# Altium footprint library EwgConnectors.PcbLib: 125 footprints (part 3 of 8)
Each footprint in its own frame and in the unit in brackets; x right, y up, seen from the top. Pads: shape width x height; smd on the part's side, far side on the other; paste and mask are expansions set on the pad; w line width, h text height; cw(c..) or ccw(c..) is an arc to the next point about the centre after c.
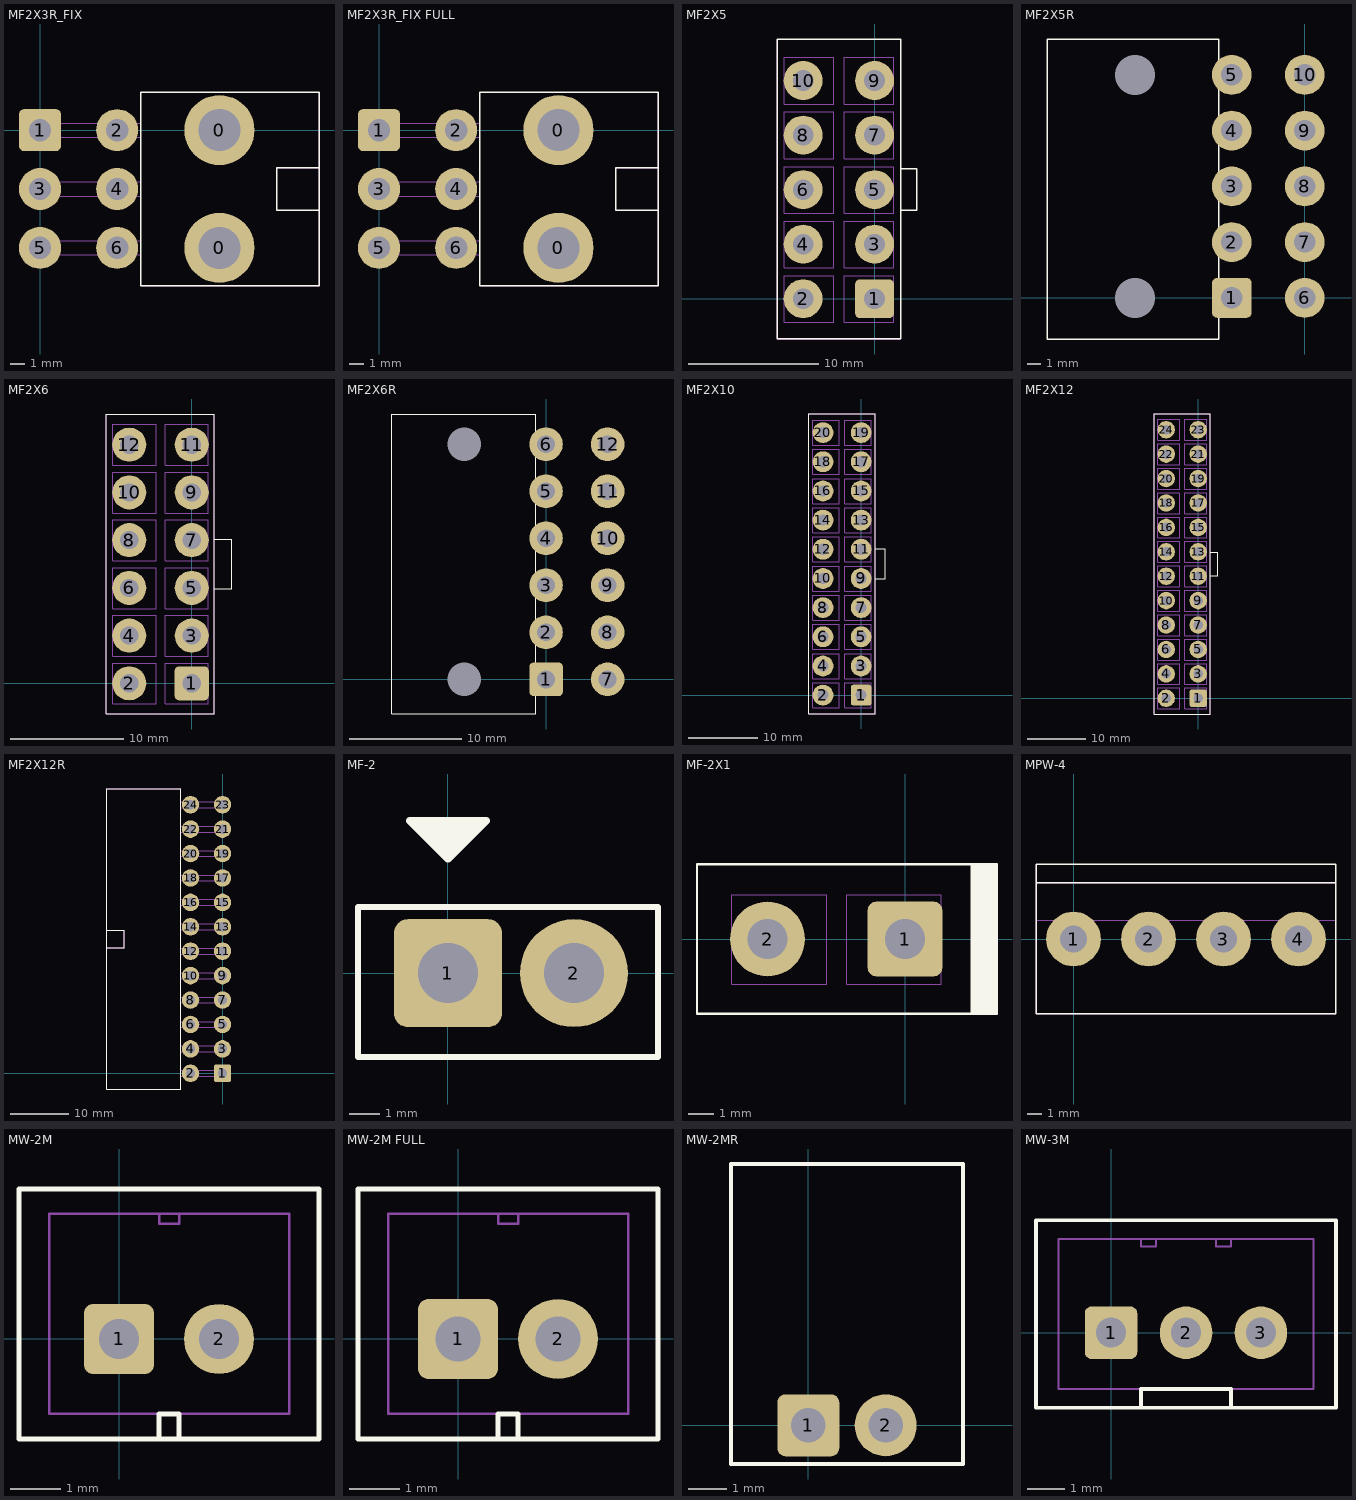
[diagram p2: the footprints below, top view; thin cyan lines are the x and y axes]

## MF2X3R_FIX [mm]
pads (8):
  round 5 hole 3: 0(12.8,-8.4) 0(12.8,0)
  rrect25% 3x3 hole 1.6: 1(0,0)
  round 3 hole 1.6: 2(5.5,0) 3(0,-4.2) 4(5.5,-4.2) 5(0,-8.4) 6(5.5,-8.4)
Top Overlay:
  lines w0.1: 19.9,-5.7 16.9,-5.7 16.9,-2.7 19.9,-2.7 ; 7.2,-11.1 7.2,2.7 19.9,2.7 19.9,-11.1 7.2,-11.1
Mechanical 1:
  lines w0.05: 7.2,-8.9 -0.6,-8.9 -0.6,-8.8 -0.6,-7.9 7.2,-7.9 ; 7.2,-4.7 -0.6,-4.7 -0.6,-4.6 -0.6,-3.7 7.2,-3.7 ; 7.2,-0.5 -0.6,-0.5 -0.6,-0.4 -0.6,0.5 7.2,0.5 ; 19.9,-5.7 16.9,-5.7 16.9,-4.2 16.9,-2.7 19.9,-2.7 ; 7.2,-11.1 7.2,2.7 19.9,2.7 19.9,-11.1 7.2,-11.1
3D body: height 11.4, standoff -3.6, extent -0.575,-11.1 19.36,3.1

## MF2X3R_FIX FULL [mm]
pads (8):
  round 5 hole 3: 0(12.8,-8.4) 0(12.8,0)
  rrect25% 3x3 hole 1.6: 1(0,0)
  round 3 hole 1.6: 2(5.5,0) 3(0,-4.2) 4(5.5,-4.2) 5(0,-8.4) 6(5.5,-8.4)
Top Overlay:
  lines w0.1: 19.9,-5.7 16.9,-5.7 16.9,-2.7 19.9,-2.7 ; 7.2,-11.1 7.2,2.7 19.9,2.7 19.9,-11.1 7.2,-11.1
Mechanical 1:
  lines w0.05: 7.2,-8.9 -0.6,-8.9 -0.6,-8.8 -0.6,-7.9 7.2,-7.9 ; 7.2,-4.7 -0.6,-4.7 -0.6,-4.6 -0.6,-3.7 7.2,-3.7 ; 7.2,-0.5 -0.6,-0.5 -0.6,-0.4 -0.6,0.5 7.2,0.5 ; 19.9,-5.7 16.9,-5.7 16.9,-4.2 16.9,-2.7 19.9,-2.7 ; 7.2,-11.1 7.2,2.7 19.9,2.7 19.9,-11.1 7.2,-11.1
3D body: height 11.4, standoff -3.6, extent -0.575,-11.1 19.36,3.1
3D body: height 14.1, standoff -0.3, extent 10.625,-11.075 30.225,2.725

## MF2X5 [mm]
pads (10):
  rrect25% 3x3 hole 1.6: 1(0,0)
  round 3 hole 1.6: 2(-5.5,0) 3(0,4.2) 4(-5.5,4.2) 5(0,8.4) 6(-5.5,8.4) 7(0,12.6) 8(-5.5,12.6) 9(0,16.8) 10(-5.5,16.8)
Top Overlay:
  lines w0.1: 2,6.8 3.25,6.8 3.25,10 2,10 ; -7.5,-3.1 -7.5,20 2,20 2,-3.1 -7.5,-3.1
Mechanical 1:
  lines w0.05: -7.5,-3.1 -7.5,20 2,20 2,-3.1 -7.5,-3.1 ; -6.94,-1.82 -6.94,1.78 -3.14,1.78 -3.14,-1.82 -6.94,-1.82 ; -6.94,2.38 -3.14,2.38 -3.14,5.98 -6.94,5.98 -6.94,2.38 ; -6.94,6.58 -3.14,6.58 -3.14,10.18 -6.94,10.18 -6.94,6.58 ; -6.94,10.78 -6.94,14.38 -3.14,14.38 -3.14,10.78 -6.94,10.78 ; -6.94,14.98 -3.14,14.98 -3.14,18.58 -6.94,18.58 -6.94,14.98 ; -2.34,-1.82 -2.34,1.78 1.46,1.78 1.46,-1.82 -2.34,-1.82 ; -2.34,2.38 1.46,2.38 1.46,5.98 -2.34,5.98 -2.34,2.38 ; -2.34,6.58 1.46,6.58 1.46,10.18 -2.34,10.18 -2.34,6.58 ; -2.34,10.78 1.46,10.78 1.46,14.38 -2.34,14.38 -2.34,10.78 ; -2.34,14.98 1.46,14.98 1.46,18.58 -2.34,18.58 -2.34,14.98
3D body: height 12.8, standoff -3.5, extent -7.8,-3.1 3.2,19.9

## MF2X5R [mm]
pads (12):
  round 0 hole 3 unplated: 0(-12.8,0) 0(-12.8,16.8)
  rrect25% 3x3 hole 1.6: 1(-5.5,0)
  round 3 hole 1.6: 2(-5.5,4.2) 3(-5.5,8.4) 4(-5.5,12.6) 5(-5.5,16.8) 6(0,0) 7(0,4.2) 8(0,8.4) 9(0,12.6) 10(0,16.8)
Top Overlay:
  lines w0.1: -19.4,-3.1 -6.5,-3.1 -6.5,19.5 -19.4,19.5 -19.4,-3.1
3D body: height 11.4, standoff -3.6, extent -19.4,-3.1 0.535,19.5

## MF2X6 [mm]
pads (12):
  rrect25% 3x3 hole 1.6: 1(0,0)
  round 3 hole 1.6: 2(-5.5,0) 3(0,4.2) 4(-5.5,4.2) 5(0,8.4) 6(-5.5,8.4) 7(0,12.6) 8(-5.5,12.6) 9(0,16.8) 10(-5.5,16.8) 11(0,21) 12(-5.5,21)
Top Overlay:
  lines w0.1: 2,8.3 3.5,8.3 3.5,12.7 2,12.7 ; -7.5,-2.7 2,-2.7 2,23.7 -7.5,23.7 -7.5,-2.7
Mechanical 1:
  lines w0.05: -7.5,-2.7 2,-2.7 2,23.7 -7.5,23.7 -7.5,-2.7 ; -6.94,-1.82 -3.14,-1.82 -3.14,1.78 -6.94,1.78 -6.94,-1.82 ; -6.94,2.38 -6.94,5.98 -3.14,5.98 -3.14,2.38 -6.94,2.38 ; -6.94,6.58 -6.94,10.18 -3.14,10.18 -3.14,6.58 -6.94,6.58 ; -6.94,10.78 -3.14,10.78 -3.14,14.38 -6.94,14.38 -6.94,10.78 ; -6.94,14.98 -6.94,18.58 -3.14,18.58 -3.14,14.98 -6.94,14.98 ; -6.94,19.18 -3.14,19.18 -3.14,22.78 -6.94,22.78 -6.94,19.18 ; -2.34,-1.82 1.46,-1.82 1.46,1.78 -2.34,1.78 -2.34,-1.82 ; -2.34,2.38 -2.34,5.98 1.46,5.98 1.46,2.38 -2.34,2.38 ; -2.34,6.58 -2.34,10.18 1.46,10.18 1.46,6.58 -2.34,6.58 ; -2.34,10.78 -2.34,14.38 1.46,14.38 1.46,10.78 -2.34,10.78 ; -2.34,14.98 -2.34,18.58 1.46,18.58 1.46,14.98 -2.34,14.98 ; -2.34,19.18 -2.34,22.78 1.46,22.78 1.46,19.18 -2.34,19.18

## MF2X6R [mm]
pads (14):
  round 0 hole 3 unplated: 0(-7.3,0) 0(-7.3,21)
  rrect25% 3x3 hole 1.6: 1(0,0)
  round 3 hole 1.6: 2(0,4.2) 3(0,8.4) 4(0,12.6) 5(0,16.8) 6(0,21) 7(5.5,0) 8(5.5,4.2) 9(5.5,8.4) 10(5.5,12.6) 11(5.5,16.8) 12(5.5,21)
Top Overlay:
  lines w0.1: -13.8,-3.1 -0.9,-3.1 -0.9,23.7 -13.8,23.7 -13.8,-3.1
3D body: height 11.4, standoff -3.6, extent -13.835,-3.1 6.1,23.7

## MF2X10 [mm]
pads (20):
  rrect25% 3x3 hole 1.6: 1(0,0)
  round 3 hole 1.6: 2(-5.5,0) 3(0,4.2) 4(-5.5,4.2) 5(0,8.4) 6(-5.5,8.4) 7(0,12.6) 8(-5.5,12.6) 9(0,16.8) 10(-5.5,16.8) 11(0,21) 12(-5.5,21) 13(0,25.2) 14(-5.5,25.2) 15(0,29.4) 16(-5.5,29.4) 17(0,33.6) 18(-5.5,33.6) 19(0,37.8) 20(-5.5,37.8)
Top Overlay:
  lines w0.1: 2.06,16.78 3.46,16.78 3.46,21.08 2.06,21.08 ; -7.54,-2.72 2.06,-2.72 2.06,40.48 -7.54,40.48 -7.54,-2.72
Mechanical 1:
  lines w0.05: -7.54,-2.72 2.06,-2.72 2.06,40.48 -7.54,40.48 -7.54,-2.72 ; -6.94,-1.82 -3.14,-1.82 -3.14,1.78 -6.94,1.78 -6.94,-1.82 ; -6.94,2.38 -6.94,5.98 -3.14,5.98 -3.14,2.38 -6.94,2.38 ; -6.94,6.58 -6.94,10.18 -3.14,10.18 -3.14,6.58 -6.94,6.58 ; -6.94,10.78 -3.14,10.78 -3.14,14.38 -6.94,14.38 -6.94,10.78 ; -6.94,14.98 -6.94,18.58 -3.14,18.58 -3.14,14.98 -6.94,14.98 ; -6.94,19.18 -3.14,19.18 -3.14,22.78 -6.94,22.78 -6.94,19.18 ; -6.94,23.38 -6.94,26.98 -3.14,26.98 -3.14,23.38 -6.94,23.38 ; -6.94,27.58 -3.14,27.58 -3.14,31.18 -6.94,31.18 -6.94,27.58 ; -6.94,31.78 -6.94,35.38 -3.14,35.38 -3.14,31.78 -6.94,31.78 ; -6.94,35.98 -3.14,35.98 -3.14,39.58 -6.94,39.58 -6.94,35.98 ; -2.34,-1.82 1.46,-1.82 1.46,1.78 -2.34,1.78 -2.34,-1.82 ; -2.34,2.38 -2.34,5.98 1.46,5.98 1.46,2.38 -2.34,2.38 ; -2.34,6.58 -2.34,10.18 1.46,10.18 1.46,6.58 -2.34,6.58 ; -2.34,10.78 1.46,10.78 1.46,14.38 -2.34,14.38 -2.34,10.78 ; -2.34,14.98 -2.34,18.58 1.46,18.58 1.46,14.98 -2.34,14.98 ; -2.34,19.18 1.46,19.18 1.46,22.78 -2.34,22.78 -2.34,19.18 ; -2.34,23.38 -2.34,26.98 1.46,26.98 1.46,23.38 -2.34,23.38 ; -2.34,27.58 1.46,27.58 1.46,31.18 -2.34,31.18 -2.34,27.58 ; -2.34,31.78 -2.34,35.38 1.46,35.38 1.46,31.78 -2.34,31.78 ; -2.34,35.98 1.46,35.98 1.46,39.58 -2.34,39.58 -2.34,35.98

## MF2X12 [mm]
pads (24):
  rrect25% 3x3 hole 1.6: 1(0,0)
  round 3 hole 1.6: 2(-5.5,0) 3(0,4.2) 4(-5.5,4.2) 5(0,8.4) 6(-5.5,8.4) 7(0,12.6) 8(-5.5,12.6) 9(0,16.8) 10(-5.5,16.8) 11(0,21) 12(-5.5,21) 13(0,25.2) 14(-5.5,25.2) 15(0,29.4) 16(-5.5,29.4) 17(0,33.6) 18(-5.5,33.6) 19(0,37.8) 20(-5.5,37.8) 21(0,42) 22(-5.5,42) 23(0,46.2) 24(-5.5,46.2)
Top Overlay:
  lines w0.1: 2.1,21.1 3.4,21.1 3.4,25.1 2.1,25.1 ; -7.6,-2.7 -7.6,48.9 2.1,48.9 2.1,-2.7 -7.6,-2.7
Mechanical 1:
  lines w0.05: -7.6,-2.7 -7.6,48.9 2.1,48.9 2.1,-2.7 -7.6,-2.7 ; -6.94,-1.82 -3.14,-1.82 -3.14,1.78 -6.94,1.78 -6.94,-1.82 ; -6.94,2.38 -3.14,2.38 -3.14,5.98 -6.94,5.98 -6.94,2.38 ; -6.94,6.58 -3.14,6.58 -3.14,10.18 -6.94,10.18 -6.94,6.58 ; -6.94,10.78 -6.94,14.38 -3.14,14.38 -3.14,10.78 -6.94,10.78 ; -6.94,14.98 -3.14,14.98 -3.14,18.58 -6.94,18.58 -6.94,14.98 ; -6.94,19.18 -6.94,22.78 -3.14,22.78 -3.14,19.18 -6.94,19.18 ; -6.94,23.38 -3.14,23.38 -3.14,26.98 -6.94,26.98 -6.94,23.38 ; -6.94,27.58 -3.14,27.58 -3.14,31.18 -6.94,31.18 -6.94,27.58 ; -6.94,31.78 -3.14,31.78 -3.14,35.38 -6.94,35.38 -6.94,31.78 ; -6.94,35.98 -3.14,35.98 -3.14,39.58 -6.94,39.58 -6.94,35.98 ; -6.94,40.18 -3.14,40.18 -3.14,43.78 -6.94,43.78 -6.94,40.18 ; -6.94,44.38 -3.14,44.38 -3.14,47.98 -6.94,47.98 -6.94,44.38 ; -2.34,-1.82 1.46,-1.82 1.46,1.78 -2.34,1.78 -2.34,-1.82 ; -2.34,2.38 1.46,2.38 1.46,5.98 -2.34,5.98 -2.34,2.38 ; -2.34,6.58 1.46,6.58 1.46,10.18 -2.34,10.18 -2.34,6.58 ; -2.34,10.78 -2.34,14.38 1.46,14.38 1.46,10.78 -2.34,10.78 ; -2.34,14.98 1.46,14.98 1.46,18.58 -2.34,18.58 -2.34,14.98 ; -2.34,19.18 -2.34,22.78 1.46,22.78 1.46,19.18 -2.34,19.18 ; -2.34,23.38 1.46,23.38 1.46,26.98 -2.34,26.98 -2.34,23.38 ; -2.34,27.58 1.46,27.58 1.46,31.18 -2.34,31.18 -2.34,27.58 ; -2.34,31.78 1.46,31.78 1.46,35.38 -2.34,35.38 -2.34,31.78 ; -2.34,35.98 1.46,35.98 1.46,39.58 -2.34,39.58 -2.34,35.98 ; -2.34,40.18 1.46,40.18 1.46,43.78 -2.34,43.78 -2.34,40.18 ; -2.34,44.38 1.46,44.38 1.46,47.98 -2.34,47.98 -2.34,44.38

## MF2X12R [mm]
pads (24):
  rrect25% 3x3 hole 1.6: 1(0,0)
  round 3 hole 1.6: 2(-5.5,0) 3(0,4.2) 4(-5.5,4.2) 5(0,8.4) 6(-5.5,8.4) 7(0,12.6) 8(-5.5,12.6) 9(0,16.8) 10(-5.5,16.8) 11(0,21) 12(-5.5,21) 13(0,25.2) 14(-5.5,25.2) 15(0,29.4) 16(-5.5,29.4) 17(0,33.6) 18(-5.5,33.6) 19(0,37.8) 20(-5.5,37.8) 21(0,42) 22(-5.5,42) 23(0,46.2) 24(-5.5,46.2)
Top Overlay:
  lines w0.1: -19.91,9.9 -19.91,23.7 ; -19.91,11.1 -19.91,-2.7 -7.21,-2.7 -7.21,11.1 ; -19.91,21.6 -16.91,21.6 -16.91,23.1 -16.91,24.6 -19.91,24.6 ; -19.91,22.5 -19.91,36.3 ; -19.91,35.1 -19.91,48.9 -7.21,48.9 -7.21,35.1 ; -7.21,9.9 -7.21,23.7 ; -7.21,22.5 -7.21,36.3
Mechanical 1:
  lines w0.05: -7.21,-0.5 0.59,-0.5 0.59,0.4 0.59,0.5 -7.21,0.5 ; -7.21,3.7 0.59,3.7 0.59,4.6 0.59,4.7 -7.21,4.7 ; -7.21,7.9 0.59,7.9 0.59,8.8 0.59,8.9 -7.21,8.9 ; -7.21,12.1 0.59,12.1 0.59,13 0.59,13.1 -7.21,13.1 ; -7.21,16.3 0.59,16.3 0.59,17.2 0.59,17.3 -7.21,17.3 ; -7.21,20.5 0.59,20.5 0.59,21.4 0.59,21.5 -7.21,21.5 ; -7.21,24.7 0.59,24.7 0.59,25.6 0.59,25.7 -7.21,25.7 ; -7.21,28.9 0.59,28.9 0.59,29.8 0.59,29.9 -7.21,29.9 ; -7.21,33.1 0.59,33.1 0.59,34 0.59,34.1 -7.21,34.1 ; -7.21,37.3 0.59,37.3 0.59,38.2 0.59,38.3 -7.21,38.3 ; -7.21,41.5 0.59,41.5 0.59,42.4 0.59,42.5 -7.21,42.5 ; -7.21,45.7 0.59,45.7 0.59,46.6 0.59,46.7 -7.21,46.7
  lines w0.1: -19.91,9.9 -19.91,23.7 ; -19.91,11.1 -19.91,-2.7 -7.21,-2.7 -7.21,11.1 ; -19.91,21.6 -16.91,21.6 -16.91,23.1 -16.91,24.6 -19.91,24.6 ; -19.91,22.5 -19.91,36.3 ; -19.91,35.1 -19.91,48.9 -7.21,48.9 -7.21,35.1 ; -7.21,9.9 -7.21,23.7 ; -7.21,22.5 -7.21,36.3

## MF-2 [mm]
pads (2):
  rrect25% 3.6x3.6 hole 2: 1(0,0)
  round 3.6 hole 2: 2(4.2,0)
Top Overlay:
  lines w0.2: -3,-2.8 -3,2.2 7,2.2 7,-2.8 -3,-2.8
  lines w0.254: -0.96,4.96 0.04,3.96 ; -0.86,5.06 0.14,4.06 ; -0.56,4.96 0.24,4.16 ; -0.36,4.96 0.34,4.26 ; -0.26,5.06 0.44,4.36 ; 0.04,5.06 0.64,4.46 ; 0.34,5.06 0.74,4.66 ; 0.64,5.06 0.94,4.76 ; 0.84,5.06 1.04,4.86 ; -1.27,5.08 1.27,5.08 0,3.81 -1.27,5.08

## MF-2X1 [mm]
pads (2):
  rrect25% 3x3 hole 1.6: 1(0,0)
  round 3 hole 1.6: 2(-5.5,0)
Top Overlay:
  lines w0.1: 2.68,-3 3.68,-3 3.68,3 2.68,3 ; 2.68,-3 2.68,3 ; 2.68,-3 -8.32,-3 -8.32,3 2.68,3
  lines w0.2: 2.78,-2.9 2.78,2.9 ; 2.88,-2.9 2.88,2.9 ; 2.98,-2.9 2.98,2.9 ; 3.08,-2.9 3.08,2.9 ; 3.18,-2.9 3.18,2.9 ; 3.28,-2.9 3.28,2.9 ; 3.38,-2.9 3.38,2.9 ; 3.48,-2.9 3.48,2.9 ; 3.58,-2.9 3.58,2.9
Mechanical 1:
  lines w0.05: -8.32,-3 -8.32,3 2.68,3 2.68,-3 -8.32,-3 ; -6.94,-1.82 -6.94,1.78 -3.14,1.78 -3.14,-1.82 -6.94,-1.82 ; -2.34,-1.82 1.46,-1.82 1.46,1.78 -2.34,1.78 -2.34,-1.82

## MPW-4 [mm]
pads (4):
  round 3.7 hole 1.85: 1(0,0) 2(5.08,0) 3(10.16,0) 4(15.24,0)
Top Overlay:
  lines w0.1: -2.54,3.81 17.78,3.81 ; -2.54,-5.08 17.78,-5.08 17.78,5.08 -2.54,5.08 -2.54,-5.08
Mechanical 1:
  lines w0.05: -2.54,1.27 17.78,1.27 ; -2.54,3.81 17.78,3.81 ; -0.635,-0.635 -0.318,-0.318 ; -0.635,-0.635 -0.635,0.635 ; -0.635,-0.635 0.635,-0.635 ; -0.635,0.635 -0.318,0.318 ; -0.635,0.635 0.635,0.635 ; -0.318,-0.318 -0.318,0.318 ; -0.318,-0.318 0.318,-0.318 ; -0.318,0.318 0.318,0.318 ; 0.318,-0.318 0.635,-0.635 ; 0.318,-0.318 0.318,0.318 ; 0.318,0.318 0.635,0.635 ; 0.635,-0.635 0.635,0.635 ; 4.445,-0.635 5.715,-0.635 ; 4.445,-0.635 4.763,-0.318 ; 4.445,-0.635 4.445,0.635 ; 4.445,0.635 5.715,0.635 ; 4.445,0.635 4.763,0.318 ; 4.763,-0.318 5.397,-0.318 ; 4.763,-0.318 4.763,0.318 ; 4.763,0.318 5.397,0.318 ; 5.397,-0.318 5.715,-0.635 ; 5.397,-0.318 5.397,0.318 ; 5.397,0.318 5.715,0.635 ; 5.715,-0.635 5.715,0.635 ; 9.525,-0.635 10.795,-0.635 ; 9.525,-0.635 9.842,-0.318 ; 9.525,-0.635 9.525,0.635 ; 9.525,0.635 10.795,0.635 ; 9.525,0.635 9.842,0.318 ; 9.842,-0.318 10.477,-0.318 ; 9.842,-0.318 9.842,0.318 ; 9.842,0.318 10.477,0.318 ; 10.477,-0.318 10.795,-0.635 ; 10.477,-0.318 10.477,0.318 ; 10.477,0.318 10.795,0.635 ; 10.795,-0.635 10.795,0.635 ; 14.605,-0.635 15.875,-0.635 ; 14.605,-0.635 14.922,-0.318 ; 14.605,-0.635 14.605,0.635 ; 14.605,0.635 15.875,0.635 ; 14.605,0.635 14.922,0.318 ; 14.922,-0.318 15.557,-0.318 ; 14.922,-0.318 14.922,0.318 ; 14.922,0.318 15.557,0.318 ; 15.557,-0.318 15.875,-0.635 ; 15.557,-0.318 15.557,0.318 ; 15.557,0.318 15.875,0.635 ; 15.875,-0.635 15.875,0.635 ; -2.54,-5.08 17.78,-5.08 17.78,5.08 -2.54,5.08 -2.54,-5.08

## MW-2M [mm]
pads (2):
  rrect25% 1.4x1.4 hole 0.8: 1(0,0)
  round 1.4 hole 0.8: 2(2,0)
Top Overlay:
  lines w0.1: 0.8,-2 0.8,-1.5 1.2,-1.5 1.2,-2 ; -2,-2 -2,3 4,3 4,2 4,-2 -2,-2
Mechanical 1:
  lines w0.05: 0.8,-2 0.8,-1.5 -1.4,-1.5 -1.4,2.5 3.4,2.5 3.4,-1.5 1.2,-1.5 1.2,-2 ; 0.8,2.5 0.8,2.3 1.2,2.3 1.2,2.5 ; 1.2,-2 -2,-2 -2,3 4,3 4,-2 1.2,-2 ; -0.3,-0.3 0.3,-0.3 0.3,0.3 -0.3,0.3 -0.3,-0.3 ; 1.7,-0.3 2.3,-0.3 2.3,0.3 1.7,0.3 1.7,-0.3
3D body: height 6, standoff -3, extent -2,-2 4,3

## MW-2M FULL [mm]
pads (2):
  rrect25% 1.6x1.6 hole 0.9: 1(0,0)
  round 1.6 hole 0.9: 2(2,0)
Top Overlay:
  lines w0.1: 0.8,-2 0.8,-1.5 1.2,-1.5 1.2,-2 ; -2,-2 4,-2 4,2 4,3 -2,3 -2,-2
Mechanical 1:
  lines w0.05: 0.8,-2 0.8,-1.5 -1.4,-1.5 -1.4,2.5 3.4,2.5 3.4,-1.5 1.2,-1.5 1.2,-2 ; 0.8,2.5 0.8,2.3 1.2,2.3 1.2,2.5 ; 1.2,-2 4,-2 4,3 -2,3 -2,-2 1.2,-2 ; -0.3,-0.3 -0.3,0.3 0.3,0.3 0.3,-0.3 -0.3,-0.3 ; 1.7,-0.3 1.7,0.3 2.3,0.3 2.3,-0.3 1.7,-0.3
3D body: height 8.9, standoff 1.5, extent -1.9,-1.75 3.9,2.75
3D body: height 6, standoff -3, extent -2,-2 4,3

## MW-2MR [mm]
pads (2):
  rrect25% 1.6x1.6 hole 0.9: 1(0,0)
  round 1.6 hole 0.9: 2(2,0)
Top Overlay:
  lines w0.1: -2,-1 -2,6.75 4,6.75 4,-1 -2,-1
Mechanical 1:
  lines w0.05: -2,-1 2.2,-1 4,-1 4,6.75 -2,6.75 -2,-1 ; -0.3,-0.3 -0.3,0.3 0.3,0.3 0.3,-0.3 -0.3,-0.3 ; 1.7,-0.3 2.3,-0.3 2.3,0.3 1.7,0.3 1.7,-0.3
3D body: height 4.85, standoff -1.95, extent -1.95,-0.8 3.95,6.8

## MW-3M [mm]
pads (3):
  rrect25% 1.4x1.4 hole 0.8: 1(0,0)
  round 1.4 hole 0.8: 2(2,0) 3(4,0)
Top Overlay:
  lines w0.1: 0.8,-2 0.8,-1.5 3.2,-1.5 3.2,-2 ; -2,-2 -2,3 6,3 6,2 6,-2 -2,-2
Mechanical 1:
  lines w0.05: 0.8,-2 0.8,-1.5 -1.4,-1.5 -1.4,2.5 5.4,2.5 5.4,-1.5 3.2,-1.5 3.2,-2 ; 0.8,2.5 0.8,2.3 1.2,2.3 1.2,2.5 ; 2.8,2.5 2.8,2.3 3.2,2.3 3.2,2.5 ; -2,-2 1.2,-2 6,-2 6,3 -2,3 -2,-2 ; -0.3,-0.3 -0.3,0.3 0.3,0.3 0.3,-0.3 -0.3,-0.3 ; 1.7,-0.3 2.3,-0.3 2.3,0.3 1.7,0.3 1.7,-0.3 ; 3.7,-0.3 4.3,-0.3 4.3,0.3 3.7,0.3 3.7,-0.3
3D body: height 6, standoff -3, extent -2,-2 6,3